# Altium footprint library Toi Library.PcbLib: 740 footprints (part 43 of 47)
Each footprint in its own frame and in the unit in brackets; x right, y up, seen from the top. Pads: shape width x height; smd on the part's side, far side on the other; paste and mask are expansions set on the pad; w line width, h text height; cw(c..) or ccw(c..) is an arc to the next point about the centre after c.
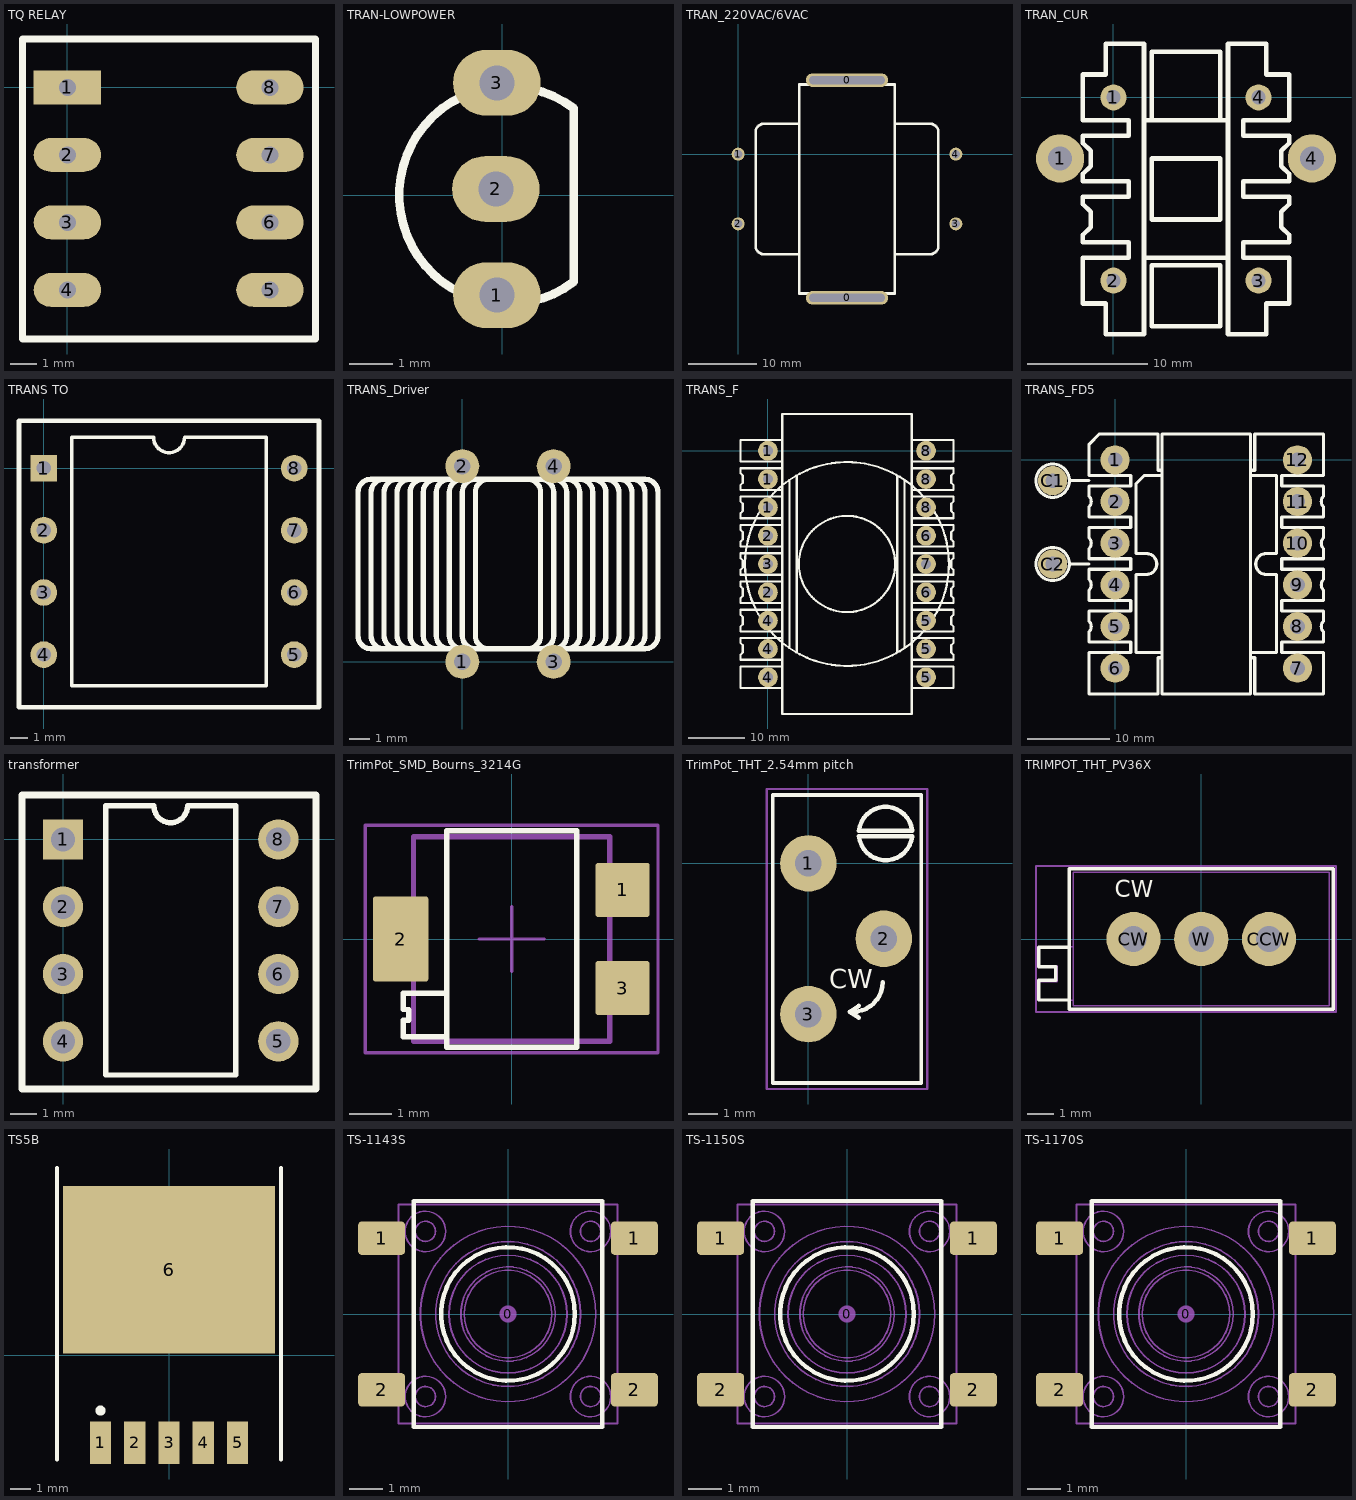
[diagram p42: the footprints below, top view; thin cyan lines are the x and y axes]

## TQ RELAY [mm]
pads (8):
  rect 2.54x1.27 hole 0.635: 1(0,0)
  oval 2.54x1.27 hole 0.635: 2(0,-2.54) 3(0,-5.08) 4(0,-7.62) 5(7.62,-7.62) 6(7.62,-5.08) 7(7.62,-2.54) 8(7.62,0)
Top Overlay:
  lines w0.254: -1.687,-9.464 9.329,-9.464 9.329,1.821 -1.687,1.821 -1.687,-9.464

## TRAN-LOWPOWER [mm] "TO, Flat Index; 3 In-Line, Axial Leads; Body Dia. 4.5mm; Leads 0.51 x 0.48 mm (max)"
height 6.86
pads (3):
  oval 2x1.5 hole 0.8: 1(-0.127,-2.286) 2(-0.151,0.139) 3(-0.127,2.564)
Top Overlay:
  lines w0.2: 1.627,-1.98 cw(c0.127,0) 1.627,1.98 1.627,-1.98
3D body "BJT.step": height 11, standoff -1, extent -2.476,-2.794 1.524,3.006

## TRAN_220VAC/6VAC [mm]
pads (6):
  oval 12x2 hole 1.2 slot 11 at 0 deg: 0(15.875,-20.955) 0(15.875,10.795)
  round 1.905 hole 1.2: 1(0,0) 2(0,-10.16) 3(31.75,-10.16) 4(31.75,0)
Top Overlay:
  lines w0.381: 8.89,-14.605 3.81,-14.605 cw(c3.81,-13.335) 2.54,-13.335 2.54,3.175 cw(c3.81,3.175) 3.81,4.445 8.89,4.445 ; 22.86,-14.605 27.94,-14.605 ccw(c27.94,-13.335) 29.21,-13.335 29.21,3.175 ccw(c27.94,3.175) 27.94,4.445 22.86,4.445 ; 8.89,-20.32 8.89,10.16 22.86,10.16 22.86,-20.32 8.89,-20.32

## TRAN_CUR [mm]
pads (6):
  round 4 hole 2: 1(-4.445,-5.08) 4(16.51,-5.08)
  round 2.159 hole 1.2: 1(0,0) 2(0,-15.24) 3(12.065,-15.24) 4(12.065,0)
Top Overlay:
  lines w0.381: 2.54,-13.335 9.525,-13.335 ; 2.54,-1.905 9.525,-1.905 ; 3.175,-1.905 3.175,3.81 8.89,3.81 8.89,-1.905 ; -2.54,-17.145 -0.635,-17.145 -0.635,-19.685 2.54,-19.685 2.54,4.445 -0.635,4.445 -0.635,1.905 -2.54,1.905 -2.54,-1.905 1.27,-1.905 1.27,-3.175 -2.54,-3.175 -2.54,-3.81 -1.905,-4.445 -1.905,-5.715 -2.54,-6.35 -2.54,-6.985 1.27,-6.985 1.27,-8.255 -2.54,-8.255 -2.54,-8.89 -1.905,-9.525 -1.905,-10.795 -2.54,-11.43 -2.54,-12.065 1.27,-12.065 1.27,-13.335 -2.54,-13.335 -2.54,-17.145 ; 3.175,-19.05 3.175,-13.97 8.89,-13.97 8.89,-19.05 3.175,-19.05 ; 3.175,-10.16 3.175,-5.08 8.89,-5.08 8.89,-10.16 3.175,-10.16 ; 9.525,-19.685 9.525,4.445 12.7,4.445 12.7,1.905 14.605,1.905 14.605,-1.905 10.795,-1.905 10.795,-3.175 14.605,-3.175 14.605,-3.81 13.97,-4.445 13.97,-5.715 14.605,-6.35 14.605,-6.985 10.795,-6.985 10.795,-8.255 14.605,-8.255 14.605,-8.89 13.97,-9.525 13.97,-10.795 14.605,-11.43 14.605,-12.065 10.795,-12.065 10.795,-13.335 14.605,-13.335 14.605,-17.145 12.7,-17.145 12.7,-19.685 9.525,-19.685

## TRANS TO [mm]
pads (8):
  rect 1.5x1.5 hole 0.8: 1(0,0)
  round 1.5 hole 0.8: 2(0,-3.5) 3(0,-7) 4(0,-10.5) 5(14.1,-10.5) 6(14.1,-7) 7(14.1,-3.5) 8(14.1,0)
Top Overlay:
  lines w0.2: 1.585,-12.25 1.585,1.75 6.175,1.75 ccw(c7.05,1.75) 7.925,1.75 12.515,1.75 12.515,-12.25 1.585,-12.25
  lines w0.254: -1.397,-13.462 15.367,-13.462 15.494,-13.462 15.494,2.667 -1.397,2.667 -1.397,-13.462
3D body "bien ap.step": height 4.69, standoff -11.87, extent 0.889,-11.944 13.289,1.276

## TRANS_Driver [mil]
pads (4):
  round 65 hole 31.5: 1(0,0) 2(0,375) 3(175,0) 4(175,375)
Top Overlay:
  lines w10: -150,25 cw(c-150,50) -175,50 -175,325 cw(c-150,325) -150,350 ; -125,25 cw(c-125,50) -150,50 -150,325 cw(c-125,325) -125,350 ; -100,25 cw(c-100,50) -125,50 -125,325 cw(c-100,325) -100,350 ; -75,25 cw(c-75,50) -100,50 -100,325 cw(c-75,325) -75,350 ; -50,25 cw(c-50,50) -75,50 -75,325 cw(c-50,325) -50,350 ; -25,25 cw(c-25,50) -50,50 -50,325 cw(c-25,325) -25,350 ; 0,25 cw(c0,50) -25,50 -25,325 cw(c0,325) 0,350 ; 25,25 cw(c25,50) 0,50 0,325 cw(c25,325) 25,350 ; 50,25 cw(c50,50) 25,50 25,325 cw(c50,325) 50,350 ; 125,25 ccw(c125,50) 150,50 150,325 ccw(c125,325) 125,350 ; 150,25 ccw(c150,50) 175,50 175,325 ccw(c150,325) 150,350 ; 175,25 ccw(c175,50) 200,50 200,325 ccw(c175,325) 175,350 ; 200,25 ccw(c200,50) 225,50 225,325 ccw(c200,325) 200,350 ; 225,25 ccw(c225,50) 250,50 250,325 ccw(c225,325) 225,350 ; 250,25 ccw(c250,50) 275,50 275,325 ccw(c250,325) 250,350 ; 275,25 ccw(c275,50) 300,50 300,325 ccw(c275,325) 275,350 ; 300,25 ccw(c300,50) 325,50 325,325 ccw(c300,325) 300,350 ; 325,25 ccw(c325,50) 350,50 350,325 ccw(c325,325) 325,350 ; -200,50 ccw(c-175,50) -175,25 350,25 ccw(c350,50) 375,50 375,325 ccw(c350,325) 350,350 -175,350 ccw(c-175,325) -200,325 -200,50

## TRANS_F [mm]
pads (18):
  round 3.5 hole 1.8: 1(0,-10) 1(0,-5) 1(0,0) 2(0,-25) 2(0,-15) 3(0,-20) 4(0,-40) 4(0,-35) 4(0,-30) 5(27.94,-40) 5(27.94,-35) 5(27.94,-30) 6(27.94,-25) 6(27.94,-15) 7(27.94,-20) 8(27.94,-10) 8(27.94,-5) 8(27.94,0)
Top Overlay:
  circle w0.381: c13.97,-20 r18
  circle w0.381: c13.97,-20 r8.5
  lines w0.381: 2.286,-41.905 -4.826,-41.905 -4.826,-38.095 2.286,-38.095 ; 2.286,-36.905 -4.826,-36.905 -4.826,-36.016 -4.445,-35.635 -4.445,-34.365 -4.826,-33.984 -4.826,-33.73 -4.826,-33.095 2.286,-33.095 ; 2.286,-31.905 -4.826,-31.905 -4.826,-31.016 -4.445,-30.635 -4.445,-29.365 -4.826,-28.984 -4.826,-28.73 -4.826,-28.095 2.286,-28.095 ; 2.286,-26.905 -4.826,-26.905 -4.826,-26.016 -4.445,-25.635 -4.445,-24.365 -4.826,-23.984 -4.826,-23.73 -4.826,-23.095 2.286,-23.095 ; 2.286,-21.905 -4.826,-21.905 -4.826,-21.016 -4.445,-20.635 -4.445,-19.365 -4.826,-18.984 -4.826,-18.73 -4.826,-18.095 2.286,-18.095 ; 2.286,-16.905 -4.826,-16.905 -4.826,-16.016 -4.445,-15.635 -4.445,-14.365 -4.826,-13.984 -4.826,-13.73 -4.826,-13.095 2.286,-13.095 ; 2.286,-11.905 -4.826,-11.905 -4.826,-11.016 -4.445,-10.635 -4.445,-9.365 -4.826,-8.984 -4.826,-8.73 -4.826,-8.095 2.286,-8.095 ; 2.286,-6.905 -4.826,-6.905 -4.826,-6.016 -4.445,-5.635 -4.445,-4.365 -4.826,-3.984 -4.826,-3.73 -4.826,-3.095 2.286,-3.095 ; 2.286,-1.905 -4.826,-1.905 -4.826,1.905 2.286,1.905 ; 3.81,-34.798 3.81,-5.232 ; 5.08,-35.56 5.08,-4.42 ; 22.86,-35.611 22.86,-4.42 ; 24.13,-34.747 24.13,-5.283 ; 25.654,-41.905 32.766,-41.905 32.766,-38.095 25.654,-38.095 ; 25.654,-36.905 32.766,-36.905 32.766,-36.016 32.385,-35.635 32.385,-34.365 32.766,-33.984 32.766,-33.73 32.766,-33.095 25.654,-33.095 ; 25.654,-31.905 32.766,-31.905 32.766,-31.016 32.385,-30.635 32.385,-29.365 32.766,-28.984 32.766,-28.73 32.766,-28.095 25.654,-28.095 ; 25.654,-26.905 32.766,-26.905 32.766,-26.016 32.385,-25.635 32.385,-24.365 32.766,-23.984 32.766,-23.73 32.766,-23.095 25.654,-23.095 ; 25.654,-21.905 32.766,-21.905 32.766,-21.016 32.385,-20.635 32.385,-19.365 32.766,-18.984 32.766,-18.73 32.766,-18.095 25.654,-18.095 ; 25.654,-16.905 32.766,-16.905 32.766,-16.016 32.385,-15.635 32.385,-14.365 32.766,-13.984 32.766,-13.73 32.766,-13.095 25.654,-13.095 ; 25.654,-11.905 32.766,-11.905 32.766,-11.016 32.385,-10.635 32.385,-9.365 32.766,-8.984 32.766,-8.73 32.766,-8.095 25.654,-8.095 ; 25.654,-6.905 32.766,-6.905 32.766,-6.016 32.385,-5.635 32.385,-4.365 32.766,-3.984 32.766,-3.73 32.766,-3.095 25.654,-3.095 ; 25.654,-1.905 32.766,-1.905 32.766,1.905 25.654,1.905 ; 2.54,-46.5 2.54,6.5 25.4,6.5 25.4,-46.5 2.54,-46.5

## TRANS_FD5 [mil]
pads (14):
  round 140 hole 70.87: 1(0,0) 2(0,-200) 3(0,-400) 4(0,-600) 5(0,-800) 6(0,-1000) 7(875,-1000) 8(875,-800) 9(875,-600) 10(875,-400) 11(875,-200) 12(875,0) C1(-300,-100) C2(-300,-500)
Top Overlay:
  circle w15: c-300,-100 r80
  circle w15: c-300,-500 r80
  lines w15: -220,-500 -125,-500 ; -220,-100 -125,-100 ; 225,-950 205,-950 205,-1125 -125,-1125 -125,-975 -125,-925 75,-925 75,-875 -125,-875 -125,-825 ccw(c-150,-800) -125,-775 -125,-725 75,-725 75,-675 -125,-675 -125,-625 ccw(c-150,-600) -125,-575 -125,-525 75,-525 75,-475 -125,-475 -125,-425 ccw(c-150,-400) -125,-375 -125,-325 75,-325 75,-275 -125,-275 -125,-225 ccw(c-150,-200) -125,-175 -125,-125 75,-125 75,-75 -125,-75 -125,75 -75,125 5,125 205,125 205,-50 225,-50 ; 225,-925 100,-925 100,-550 150,-550 ccw(c150,-500) 150,-450 100,-450 100,-115 140,-75 225,-75 ; 650,-950 670,-950 670,-1125 1000,-1125 1000,-975 1000,-925 800,-925 800,-875 1000,-875 1000,-825 cw(c1025,-800) 1000,-775 1000,-725 800,-725 800,-675 1000,-675 1000,-625 cw(c1025,-600) 1000,-575 1000,-525 800,-525 800,-475 1000,-475 1000,-425 cw(c1025,-400) 1000,-375 1000,-325 800,-325 800,-275 1000,-275 1000,-225 cw(c1025,-200) 1000,-175 1000,-125 800,-125 800,-75 1000,-75 1000,125 870,125 670,125 670,-50 650,-50 ; 650,-925 775,-925 775,-550 725,-550 cw(c725,-500) 725,-450 775,-450 775,-75 650,-75 ; 225,-1125 650,-1125 650,125 225,125 225,-1125

## transformer [mm]
pads (8):
  rect 1.5x1.5 hole 0.9: 1(0,0)
  round 1.5 hole 0.9: 2(0,-2.5) 3(0,-5) 4(0,-7.5) 5(8,-7.5) 6(8,-5) 7(8,-2.5) 8(8,0)
Top Overlay:
  lines w0.2: 1.585,-8.75 1.585,1.25 3.375,1.25 ccw(c4,1.25) 4.625,1.25 6.415,1.25 6.415,-8.75 1.585,-8.75
  lines w0.254: -1.524,-9.271 9.398,-9.271 9.398,1.651 -1.524,1.651 -1.524,-9.271
3D body "bien ap.step": height 11.88, standoff -4.67, extent -2.136,-10.547 10.264,2.673

## TrimPot_SMD_Bourns_3214G [mm] "Bourns- 3214G - TRIMMER"
height 3.81
pads (3):
  rrect10% 1.27x1.27 smd: 1(2.6,1.15) 3(2.6,-1.15)
  rrect10% 1.3x2 smd: 2(-2.6,0)
Top Overlay:
  lines w0.127: -1.524,-2.286 -2.54,-2.286 -2.54,-1.905 -2.413,-1.905 -2.413,-1.651 -2.54,-1.651 -2.54,-1.27 -1.524,-1.27 ; -1.524,-2.54 1.524,-2.54 1.524,2.54 -1.524,2.54 -1.524,-2.54
Mechanical 13:
  lines w0.127: -2.3,-2.4 -2.3,2.4 2.3,2.4 2.3,-2.4 -2.3,-2.4
Mechanical 15:
  lines w0.076: -0.762,0 0.762,0 ; 0,-0.762 0,0.762 ; -3.429,-2.667 -3.429,2.667 3.429,2.667 3.429,-2.667 -3.429,-2.667
3D body "Trimpot 3214G.stp": height 3.9, standoff 0.2, extent -2.3,-2.4 2.3,2.4
3D body: height 0.2, standoff 0, extent -3,-0.65 -1.6,0.65
3D body: height 0.2, standoff 0, extent 1.6,0.7 3,1.6
3D body: height 0.2, standoff 0, extent 1.6,-1.6 3,-0.7
3D body: height 3.9, standoff 3.9, extent -2.3,-2.4 2.3,2.4

## TrimPot_THT_2.54mm pitch [mil] "TRIMMER, MURATA, PV36Y"
height 421.26
pads (3):
  round 75 hole 35: 1(0,0) 2(100,-100) 3(0,-200)
Top Overlay:
  lines w5: -47.24,-291.34 -47.24,90.55 149.61,90.55 149.61,-291.34 -47.24,-291.34
  lines w6: 58.86,-197.05 ccw(c58.86,-157.48) 98.43,-157.48 ; 66.93,-204.72 55.12,-197.05 66.93,-188.98 ; 67.07,35.81 137.65,35.81 ; 67.06,43.31 137.66,43.31 ; 67.12,43.3 cw(c102.36,39.55) 137.6,43.3 ; 67.13,35.81 ccw(c102.36,39.55) 137.59,35.81
  text "CW" at 27.56,-165.35 h25
Mechanical 13:
  lines w3: -47.24,-291.34 -47.24,90.55 149.61,90.55 149.61,-291.34 -47.24,-291.34
Mechanical 15:
  lines w3: -30,0 30,0 ; 0,-30 0,30 ; -55.12,-299.34 157.48,-299.34 157.48,98.66 -55.12,98.66 -55.12,-299.34
3D body "3100-517 TrimPot.stp": height 444.88, standoff -236.22, extent -47.24,-287.4 149.61,90.55

## TRIMPOT_THT_PV36X [mil] "TRIMMER, MURATA, PV36X"
height 393.7
pads (3):
  round 80 hole 38: CCW(100,0) CW(-100,0) W(0,0)
Top Overlay:
  lines w5: -195,-90 -240,-90 -240,-61 -215,-61 -215,-41 -240,-41 -240,-12 -195,-12 ; -195,-104 195,-104 195,104 -195,104 -195,-104
  text "CW" at -127.56,61.69 h25
Mechanical 13:
  lines w1.97: -188.98,-90.55 -240.16,-90.55 -240.16,-62.99 -212.6,-62.99 -212.6,-39.37 -240.16,-39.37 -240.16,-11.81 -188.98,-11.81 ; -188.98,-98.43 -188.98,98.43 188.98,98.43 188.98,-98.43 -188.98,-98.43
Mechanical 15:
  lines w3: -244,-108 -244,108 199,108 199,-108 -244,-108
3D body: height 393.7, standoff -110.24, extent -240.16,-98.42 188.98,98.43

## TS5B [mm]
height 7.62
pads (6):
  rect 1.05x2.1 smd: 1(-3.399,-4.346) 2(-1.699,-4.346) 3(0.001,-4.346) 4(1.701,-4.346) 5(3.401,-4.346)
  rect 10.5x8.3 smd: 6(0,4.225)
Top Overlay:
  circle w0.25: c-3.399,-2.746 r0.125
  lines w0.2: -5.55,-5.175 -5.55,9.275 ; 5.55,-5.175 5.55,9.275
3D body "User Library-TO-263-5.STEP": height 4.58, standoff 0.02, extent -5.08,-4.775 5.08,9.24

## TS-1143S [mm] "6.5x6.5mm SMD tact switch 4.3mm stem"
height 4.3
pads (5):
  round 0.508 on Mech15: 0(0,0)
  rrect25% 1.4x1 smd: 1(-3.75,2.25) 1(3.75,2.25) 2(-3.75,-2.25) 2(3.75,-2.25)
Top Overlay:
  circle w0.127: c0,0 r1.984
  lines w0.127: -2.794,-3.35 -2.794,3.35 2.794,3.35 2.794,-3.35 -2.794,-3.35
Mechanical 13:
  circle w0.05: c0,0 r1.4
  circle w0.05: c0,0 r1.3
  circle w0.05: c0,-0.002 r1.75
  circle w0.05: c0,0 r2.15
  circle w0.05: c0,0 r2.6
  circle w0.05: c2.45,2.452 r0.3
  circle w0.05: c-2.45,2.452 r0.3
  circle w0.05: c2.45,-2.448 r0.3
  circle w0.05: c-2.45,-2.448 r0.3
  circle w0.05: c-2.45,2.45 r0.6
  circle w0.05: c2.45,2.45 r0.6
  circle w0.05: c2.45,-2.45 r0.6
  circle w0.05: c-2.45,-2.45 r0.6
  lines w0.05: -3.591,-2.6 -3.591,-1.9 ; -3.591,1.9 -3.591,2.6 ; -3.571,-2.6 -3.571,-1.9 ; -3.571,1.9 -3.571,2.6 ; -3.468,-2.6 -3.468,-1.9 ; -3.468,1.9 -3.468,2.6 ; -3.253,-2.6 -3.253,-1.9 ; -3.253,1.9 -3.253,2.6 ; -3.25,-2.6 -4,-2.6 -4,-1.9 -3.25,-1.9 ; -3.25,1.9 -4,1.9 -4,2.6 -3.25,2.6 ; 3.25,-2.6 4,-2.6 4,-1.9 3.25,-1.9 ; 3.25,1.9 4,1.9 4,2.6 3.25,2.6 ; 3.253,-2.6 3.253,-1.9 ; 3.253,1.9 3.253,2.6 ; 3.468,-2.6 3.468,-1.9 ; 3.468,1.9 3.468,2.6 ; 3.571,-2.6 3.571,-1.9 ; 3.571,1.9 3.571,2.6 ; 3.591,-2.6 3.591,-1.9 ; 3.591,1.9 3.591,2.6 ; -3.25,-3.25 3.25,-3.25 3.25,3.25 -3.25,3.25 -3.25,-3.25
3D body "TS-1143S-WP.STEP": height 4.3, standoff 0, extent -4,-3.25 4,3.25

## TS-1150S [mm] "6.5x6.5mm SMD tact switch 5.0mm stem"
height 5
pads (5):
  round 0.508 on Mech15: 0(0,0)
  rrect25% 1.4x1 smd: 1(-3.75,2.25) 1(3.75,2.25) 2(-3.75,-2.25) 2(3.75,-2.25)
Top Overlay:
  circle w0.127: c0,0 r1.984
  lines w0.127: -2.794,-3.35 -2.794,3.35 2.794,3.35 2.794,-3.35 -2.794,-3.35
Mechanical 13:
  circle w0.05: c0,0 r1.4
  circle w0.05: c0,0 r1.3
  circle w0.05: c0,-0.002 r1.75
  circle w0.05: c0,0 r2.15
  circle w0.05: c0,0 r2.6
  circle w0.05: c2.45,2.452 r0.3
  circle w0.05: c-2.45,2.452 r0.3
  circle w0.05: c2.45,-2.448 r0.3
  circle w0.05: c-2.45,-2.448 r0.3
  circle w0.05: c-2.45,2.45 r0.6
  circle w0.05: c2.45,2.45 r0.6
  circle w0.05: c2.45,-2.45 r0.6
  circle w0.05: c-2.45,-2.45 r0.6
  lines w0.05: -3.591,-2.6 -3.591,-1.9 ; -3.591,1.9 -3.591,2.6 ; -3.571,-2.6 -3.571,-1.9 ; -3.571,1.9 -3.571,2.6 ; -3.468,-2.6 -3.468,-1.9 ; -3.468,1.9 -3.468,2.6 ; -3.253,-2.6 -3.253,-1.9 ; -3.253,1.9 -3.253,2.6 ; -3.25,-2.6 -4,-2.6 -4,-1.9 -3.25,-1.9 ; -3.25,1.9 -4,1.9 -4,2.6 -3.25,2.6 ; 3.25,-2.6 4,-2.6 4,-1.9 3.25,-1.9 ; 3.25,1.9 4,1.9 4,2.6 3.25,2.6 ; 3.253,-2.6 3.253,-1.9 ; 3.253,1.9 3.253,2.6 ; 3.468,-2.6 3.468,-1.9 ; 3.468,1.9 3.468,2.6 ; 3.571,-2.6 3.571,-1.9 ; 3.571,1.9 3.571,2.6 ; 3.591,-2.6 3.591,-1.9 ; 3.591,1.9 3.591,2.6 ; -3.25,-3.25 3.25,-3.25 3.25,3.25 -3.25,3.25 -3.25,-3.25
3D body "TS-1150S-WP.STEP": height 5, standoff 0, extent -4,-3.25 4,3.25

## TS-1170S [mm] "6.5x6.5mm SMD tact switch 7.0mm stem"
height 7
pads (5):
  round 0.508 on Mech15: 0(0,0)
  rrect25% 1.4x1 smd: 1(-3.75,2.25) 1(3.75,2.25) 2(-3.75,-2.25) 2(3.75,-2.25)
Top Overlay:
  circle w0.127: c0,0 r1.984
  lines w0.127: -2.794,-3.35 2.794,-3.35 2.794,3.35 -2.794,3.35 -2.794,-3.35
Mechanical 13:
  circle w0.05: c0,0 r1.4
  circle w0.05: c0,0 r1.3
  circle w0.05: c0,-0.002 r1.75
  circle w0.05: c0,0 r2.15
  circle w0.05: c0,0 r2.6
  circle w0.05: c2.45,2.452 r0.3
  circle w0.05: c-2.45,2.452 r0.3
  circle w0.05: c2.45,-2.448 r0.3
  circle w0.05: c-2.45,-2.448 r0.3
  circle w0.05: c-2.45,2.45 r0.6
  circle w0.05: c2.45,2.45 r0.6
  circle w0.05: c2.45,-2.45 r0.6
  circle w0.05: c-2.45,-2.45 r0.6
  lines w0.05: -3.591,-2.6 -3.591,-1.9 ; -3.591,1.9 -3.591,2.6 ; -3.571,-2.6 -3.571,-1.9 ; -3.571,1.9 -3.571,2.6 ; -3.468,-2.6 -3.468,-1.9 ; -3.468,1.9 -3.468,2.6 ; -3.253,-2.6 -3.253,-1.9 ; -3.253,1.9 -3.253,2.6 ; -3.25,-2.6 -4,-2.6 -4,-1.9 -3.25,-1.9 ; -3.25,1.9 -4,1.9 -4,2.6 -3.25,2.6 ; 3.25,-2.6 4,-2.6 4,-1.9 3.25,-1.9 ; 3.25,1.9 4,1.9 4,2.6 3.25,2.6 ; 3.253,-2.6 3.253,-1.9 ; 3.253,1.9 3.253,2.6 ; 3.468,-2.6 3.468,-1.9 ; 3.468,1.9 3.468,2.6 ; 3.571,-2.6 3.571,-1.9 ; 3.571,1.9 3.571,2.6 ; 3.591,-2.6 3.591,-1.9 ; 3.591,1.9 3.591,2.6 ; -3.25,-3.25 3.25,-3.25 3.25,3.25 -3.25,3.25 -3.25,-3.25
3D body "TS-1170S-WP.stp": height 7, standoff 0, extent -4,-3.25 4,3.25